# Altium footprint library con-amp.PCBLIB: 295 footprints (part 11 of 19)
Each footprint in its own frame and in the unit in brackets; x right, y up, seen from the top. Pads: shape width x height; smd on the part's side, far side on the other; paste and mask are expansions set on the pad; w line width, h text height; cw(c..) or ccw(c..) is an arc to the next point about the centre after c.
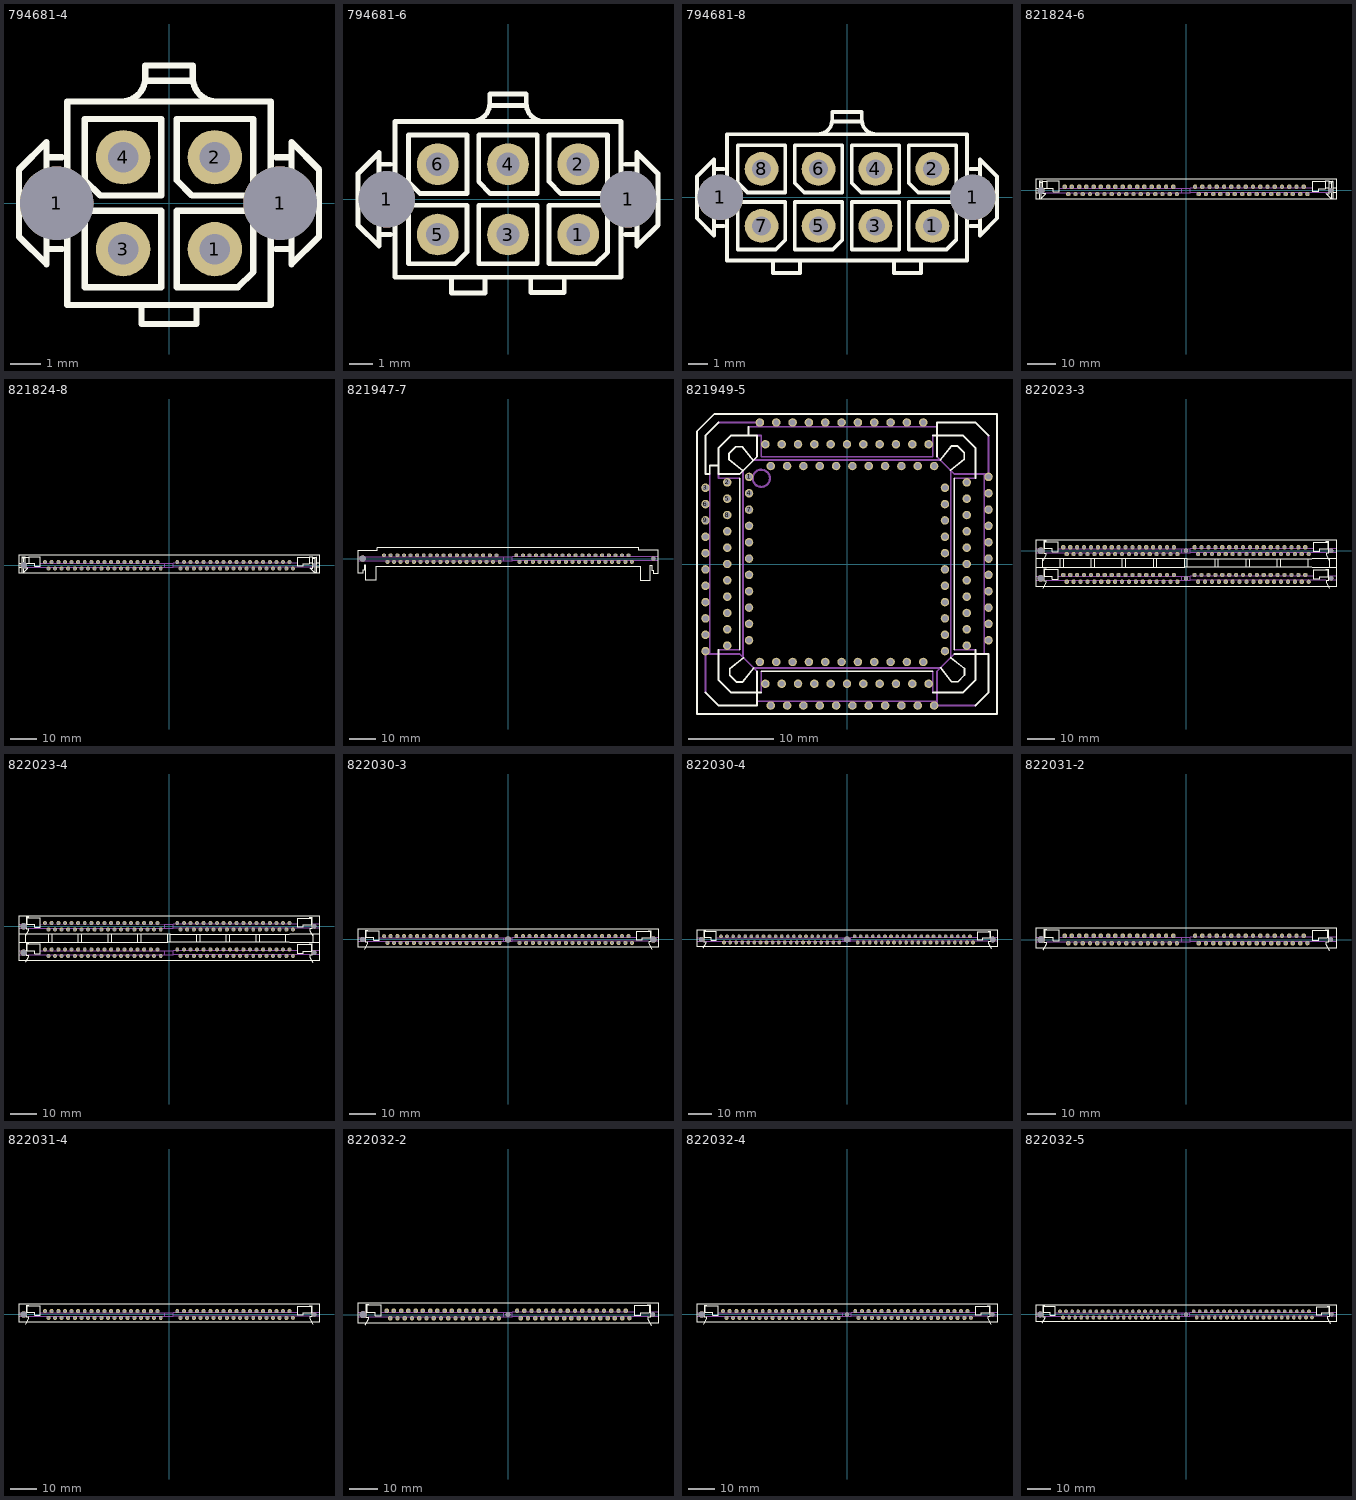
[diagram p10: the footprints below, top view; thin cyan lines are the x and y axes]

## 794681-4 [mil]
pads (6):
  round 94.49 hole 94.49: 1(-144.49,0) 1(142.91,0)
  round 70 hole 39.37: 1(59.06,-59.06) 2(59.06,59.06) 3(-59.06,-59.06) 4(-59.06,59.06)
Top Overlay:
  lines w8: -137.8,-59.06 -157.48,-59.06 ; -137.8,59.06 -157.48,59.06 ; -61.02,130.91 ccw(c-61.02,161.42) -30.51,161.42 -30.51,177.17 30.51,177.17 30.51,161.42 ccw(c61.02,161.42) 61.02,130.91 ; -35.43,-133.86 -35.43,-155.51 35.43,-155.51 35.43,-134.84 ; -29.53,157.48 29.53,157.48 ; 137.8,-59.06 157.48,-59.06 ; 137.8,59.06 157.48,59.06 ; -157.48,-59.06 -157.48,59.06 ; -157.48,-59.06 -157.48,-78.74 -192.91,-43.31 -192.91,43.31 -157.48,78.74 -157.48,59.06 ; 157.48,-59.06 157.48,59.06 ; 157.48,-59.06 157.48,-78.74 192.91,-43.31 192.91,43.31 157.48,78.74 157.48,59.06 ; -130.91,-130.91 130.91,-130.91 130.91,130.91 -130.91,130.91 -130.91,-130.91 ; -108.27,-108.27 -108.27,-9.84 -9.84,-9.84 -9.84,-108.27 -108.27,-108.27 ; -108.27,29.53 -108.27,108.27 -9.84,108.27 -9.84,9.84 -88.58,9.84 -108.27,29.53 ; 9.84,-108.27 9.84,-9.84 108.27,-9.84 108.27,-88.58 88.58,-108.27 9.84,-108.27 ; 9.84,29.53 9.84,108.27 108.27,108.27 108.27,9.84 29.53,9.84 9.84,29.53

## 794681-6 [mil]
pads (8):
  round 94.49 hole 94.49: 1(-203.54,0) 1(201.97,0)
  round 70 hole 39.37: 1(118.11,-59.06) 2(118.11,59.06) 3(0,-59.06) 4(0,59.06) 5(-118.11,-59.06) 6(-118.11,59.06)
Top Overlay:
  lines w8: -196.85,-59.06 -216.54,-59.06 ; -196.85,59.06 -216.54,59.06 ; -94.69,-135.43 -94.69,-157.09 -38.58,-157.09 -38.58,-135.43 ; -61.02,130.91 ccw(c-61.02,161.42) -30.51,161.42 -30.51,177.17 30.51,177.17 30.51,161.42 ccw(c61.02,161.42) 61.02,130.91 ; -29.53,157.48 29.53,157.48 ; 38.39,-134.84 38.39,-156.5 94.49,-156.5 94.49,-134.84 ; 196.85,-59.06 216.54,-59.06 ; 196.85,59.06 216.54,59.06 ; -216.54,-59.06 -216.54,59.06 ; -216.54,-59.06 -216.54,-78.74 -251.97,-43.31 -251.97,43.31 -216.54,78.74 -216.54,59.06 ; 216.54,-59.06 216.54,59.06 ; 216.54,-59.06 216.54,-78.74 251.97,-43.31 251.97,43.31 216.54,78.74 216.54,59.06 ; -189.96,-130.91 189.96,-130.91 189.96,130.91 -189.96,130.91 -189.96,-130.91 ; -167.32,-108.27 -167.32,-9.84 -68.9,-9.84 -68.9,-88.58 -88.58,-108.27 -167.32,-108.27 ; -167.32,29.53 -167.32,108.27 -68.9,108.27 -68.9,9.84 -147.64,9.84 -167.32,29.53 ; -49.21,-108.27 -49.21,-9.84 49.21,-9.84 49.21,-108.27 -49.21,-108.27 ; -49.21,29.53 -49.21,108.27 49.21,108.27 49.21,9.84 -29.53,9.84 -49.21,29.53 ; 68.9,-108.27 68.9,-9.84 167.32,-9.84 167.32,-88.58 147.64,-108.27 68.9,-108.27 ; 68.9,29.53 68.9,108.27 167.32,108.27 167.32,9.84 88.58,9.84 68.9,29.53

## 794681-8 [mil]
pads (10):
  round 94.49 hole 94.49: 1(-262.6,0) 1(261.02,0)
  round 70 hole 39.37: 1(177.17,-59.06) 2(177.17,59.06) 3(59.06,-59.06) 4(59.06,59.06) 5(-59.06,-59.06) 6(-59.06,59.06) 7(-177.17,-59.06) 8(-177.17,59.06)
Top Overlay:
  lines w8: -255.91,-59.06 -275.59,-59.06 ; -255.91,59.06 -275.59,59.06 ; -153.74,-135.43 -153.74,-157.09 -97.64,-157.09 -97.64,-135.43 ; -61.02,130.91 ccw(c-61.02,161.42) -30.51,161.42 -30.51,177.17 30.51,177.17 30.51,161.42 ccw(c61.02,161.42) 61.02,130.91 ; -29.53,157.48 29.53,157.48 ; 97.44,-134.84 97.44,-156.5 153.54,-156.5 153.54,-134.84 ; 255.91,-59.06 275.59,-59.06 ; 255.91,59.06 275.59,59.06 ; -275.59,-59.06 -275.59,59.06 ; -275.59,-59.06 -275.59,-78.74 -311.02,-43.31 -311.02,43.31 -275.59,78.74 -275.59,59.06 ; 275.59,-59.06 275.59,59.06 ; 275.59,-59.06 275.59,-78.74 311.02,-43.31 311.02,43.31 275.59,78.74 275.59,59.06 ; -249.02,-130.91 249.02,-130.91 249.02,130.91 -249.02,130.91 -249.02,-130.91 ; -226.38,-108.27 -226.38,-9.84 -127.95,-9.84 -127.95,-88.58 -147.64,-108.27 -226.38,-108.27 ; -226.38,29.53 -226.38,108.27 -127.95,108.27 -127.95,9.84 -206.69,9.84 -226.38,29.53 ; -108.27,-108.27 -29.53,-108.27 -9.84,-88.58 -9.84,-9.84 -108.27,-9.84 -108.27,-108.27 ; -108.27,29.53 -108.27,108.27 -9.84,108.27 -9.84,9.84 -88.58,9.84 -108.27,29.53 ; 9.84,-108.27 9.84,-9.84 108.27,-9.84 108.27,-108.27 9.84,-108.27 ; 9.84,29.53 9.84,108.27 108.27,108.27 108.27,9.84 29.53,9.84 9.84,29.53 ; 127.95,-108.27 127.95,-9.84 226.38,-9.84 226.38,-88.58 206.69,-108.27 127.95,-108.27 ; 127.95,29.53 127.95,108.27 226.38,108.27 226.38,9.84 147.64,9.84 127.95,29.53

## 821824-6 [mil]
pads (66):
  round 95 hole 95: 1(-2000,0)
  round 60 hole 40: 1(1675,-50)
  round 64 hole 64: 1(2000,0)
  oct 60x60 hole 40: 2(1625,50) 3(1575,-50) 4(1525,50) 5(1475,-50) 6(1425,50) 7(1375,-50) 8(1325,50) 9(1275,-50) 10(1225,50) 11(1175,-50) 12(1125,50) 13(1075,-50) 14(1025,50) 15(975,-50) 16(925,50) 17(875,-50) 18(825,50) 19(775,-50) 20(725,50) 21(675,-50) 22(625,50) 23(575,-50) 24(525,50) 25(475,-50) 26(425,50) 27(375,-50) 28(325,50) 29(275,-50) 30(225,50) 31(175,-50) 32(125,50) 33(-125,-50) 34(-175,50) 35(-225,-50) 36(-275,50) 37(-325,-50) 38(-375,50) 39(-425,-50) 40(-475,50) 41(-525,-50) 42(-575,50) 43(-625,-50) 44(-675,50) 45(-725,-50) 46(-775,50) 47(-825,-50) 48(-875,50) 49(-925,-50) 50(-975,50) 51(-1025,-50) 52(-1075,50) 53(-1125,-50) 54(-1175,50) 55(-1225,-50) 56(-1275,50) 57(-1325,-50) 58(-1375,50) 59(-1425,-50) 60(-1475,50) 61(-1525,-50) 62(-1575,50) 63(-1625,-50) 64(-1675,50)
Top Overlay:
  lines w6: -2070,-30 -2025,-30 ; -2070,30 -2025,30 ; -1930,30 -1975,30 ; 1930,30 1975,30 ; 2025,-115 2025,125 ; 2025,-30 2070,-30 ; 2025,30 2070,30 ; -2025,125 -2025,-115 -2005,-115 ; -2025,125 -1975,125 ; -2025,125 -2005,105 ; -2005,-115 -1935,-45 -1975,-45 -1975,30 ; -2005,-115 -2005,105 ; -2005,105 -1975,105 ; -1975,30 -1975,105 ; -1975,105 -1975,125 ; -1975,125 -1925,125 ; -1925,125 -1750,125 -1750,-15 -1835,-15 -1835,25 -1925,25 -1925,125 ; 1925,125 1750,125 1750,-15 1835,-15 1835,25 1925,25 1925,125 ; 1925,125 1975,125 ; 1975,30 1975,-45 1935,-45 2005,-115 2005,105 ; 1975,30 1975,105 ; 1975,105 1975,125 ; 1975,105 2005,105 ; 1975,125 2025,125 ; 2005,105 2025,125
  lines w10: -2070,-120 2070,-120 2070,-30 2070,30 2070,160 -2070,160 -2070,-120
Mechanical 16:
  lines w6: -1975,-30 -62,-30 ; -1745,30 -62,30 ; 1750,30 62,30 ; 1975,-30 62,-30 ; 2005,-115 2025,-115 ; -62,-30 62,-30 ; -62,-30 -62,30 ; -62,30 62,30 ; 62,-30 62,30

## 821824-8 [mil]
pads (74):
  round 95 hole 95: 1(-2200,0)
  round 60 hole 40: 1(1875,-50)
  round 64 hole 64: 1(2200,0)
  oct 60x60 hole 40: 2(1825,50) 3(1775,-50) 4(1725,50) 5(1675,-50) 6(1625,50) 7(1575,-50) 8(1525,50) 9(1475,-50) 10(1425,50) 11(1375,-50) 12(1325,50) 13(1275,-50) 14(1225,50) 15(1175,-50) 16(1125,50) 17(1075,-50) 18(1025,50) 19(975,-50) 20(925,50) 21(875,-50) 22(825,50) 23(775,-50) 24(725,50) 25(675,-50) 26(625,50) 27(575,-50) 28(525,50) 29(475,-50) 30(425,50) 31(375,-50) 32(325,50) 33(275,-50) 34(225,50) 35(175,-50) 36(125,50) 37(-125,-50) 38(-175,50) 39(-225,-50) 40(-275,50) 41(-325,-50) 42(-375,50) 43(-425,-50) 44(-475,50) 45(-525,-50) 46(-575,50) 47(-625,-50) 48(-675,50) 49(-725,-50) 50(-775,50) 51(-825,-50) 52(-875,50) 53(-925,-50) 54(-975,50) 55(-1025,-50) 56(-1075,50) 57(-1125,-50) 58(-1175,50) 59(-1225,-50) 60(-1275,50) 61(-1325,-50) 62(-1375,50) 63(-1425,-50) 64(-1475,50) 65(-1525,-50) 66(-1575,50) 67(-1625,-50) 68(-1675,50) 69(-1725,-50) 70(-1775,50) 71(-1825,-50) 72(-1875,50)
Top Overlay:
  lines w6: -2270,-30 -2225,-30 ; -2270,30 -2225,30 ; -2130,30 -2175,30 ; 2170,30 2125,30 ; 2225,-30 2270,-30 ; 2225,30 2270,30 ; -2225,125 -2225,-115 -2205,-115 ; -2225,125 -2175,125 ; -2225,125 -2205,105 ; -2205,-115 -2135,-45 -2175,-45 -2175,30 ; -2205,-115 -2205,105 ; -2205,105 -2175,105 ; -2175,30 -2175,105 ; -2175,105 -2175,125 ; -2175,125 -2125,125 ; -2125,125 -1950,125 -1950,-15 -2035,-15 -2035,25 -2125,25 -2125,125 ; 2125,30 2125,125 ; 2125,30 2125,25 2035,25 2035,-15 1950,-15 1950,125 2125,125 ; 2125,125 2175,125 ; 2175,105 2175,-45 2135,-45 2205,-115 ; 2175,105 2175,125 ; 2175,105 2205,105 ; 2175,125 2225,125 ; 2205,-115 2225,-115 2225,125 ; 2205,-115 2205,105 ; 2205,105 2225,125
  lines w10: -2270,-120 2270,-120 2270,-30 2270,30 2270,160 -2270,160 -2270,-120
Mechanical 16:
  lines w6: -2170,-30 -62,-30 ; -1945,30 -62,30 ; 1945,30 62,30 ; 2175,-30 62,-30 ; -62,-30 62,-30 ; -62,-30 -62,30 ; -62,30 62,30 ; 62,-30 62,30

## 821947-7 [mil]
pads (74):
  round 95 hole 95: 1(-2200,0)
  round 60 hole 40: 1(1875,-50)
  round 64 hole 64: 1(2200,0)
  oct 60x60 hole 40: 2(1825,50) 3(1775,-50) 4(1725,50) 5(1675,-50) 6(1625,50) 7(1575,-50) 8(1525,50) 9(1475,-50) 10(1425,50) 11(1375,-50) 12(1325,50) 13(1275,-50) 14(1225,50) 15(1175,-50) 16(1125,50) 17(1075,-50) 18(1025,50) 19(975,-50) 20(925,50) 21(875,-50) 22(825,50) 23(775,-50) 24(725,50) 25(675,-50) 26(625,50) 27(575,-50) 28(525,50) 29(475,-50) 30(425,50) 31(375,-50) 32(325,50) 33(275,-50) 34(225,50) 35(175,-50) 36(125,50) 37(-125,-50) 38(-175,50) 39(-225,-50) 40(-275,50) 41(-325,-50) 42(-375,50) 43(-425,-50) 44(-475,50) 45(-525,-50) 46(-575,50) 47(-625,-50) 48(-675,50) 49(-725,-50) 50(-775,50) 51(-825,-50) 52(-875,50) 53(-925,-50) 54(-975,50) 55(-1025,-50) 56(-1075,50) 57(-1125,-50) 58(-1175,50) 59(-1225,-50) 60(-1275,50) 61(-1325,-50) 62(-1375,50) 63(-1425,-50) 64(-1475,50) 65(-1525,-50) 66(-1575,50) 67(-1625,-50) 68(-1675,50) 69(-1725,-50) 70(-1775,50) 71(-1825,-50) 72(-1875,50)
Top Overlay:
  lines w10: -2270,-220 -2200,-220 -2200,-175 -2175,-175 -2175,-100 -2150,-100 -2150,-325 -2000,-325 -2000,-120 2000,-120 2000,-325 2150,-325 2150,-100 2175,-100 2175,-175 2200,-175 2200,-220 2270,-220 2270,125 1975,125 1975,160 -1975,160 -1975,125 -2270,125 -2270,-220
Mechanical 16:
  lines w6: -2260,-30 -62,-30 ; -2260,30 -62,30 ; 2265,-30 62,-30 ; 2265,30 62,30 ; -62,-30 62,-30 ; -62,-30 -62,30 ; -62,30 62,30 ; 62,-30 62,30

## 821949-5 [mil]
pads (132):
  round 39 hole 26: 1(-450,400) 2(-550,375) 3(-650,350) 4(-450,325) 5(-550,300) 6(-650,275) 7(-450,250) 8(-550,225) 9(-650,200) 10(-450,175) 11(-550,150) 12(-650,125) 13(-450,100) 14(-550,75) 15(-650,50) 16(-450,25) 17(-550,0) 18(-650,-25) 19(-450,-50) 20(-550,-75) 21(-650,-100) 22(-450,-125) 23(-550,-150) 24(-650,-175) 25(-450,-200) 26(-550,-225) 27(-650,-250) 28(-450,-275) 29(-550,-300) 30(-650,-325) 31(-450,-350) 32(-550,-375) 33(-650,-400) 34(-400,-450) 35(-375,-550) 36(-350,-650) 37(-325,-450) 38(-300,-550) 39(-275,-650) 40(-250,-450) 41(-225,-550) 42(-200,-650) 43(-175,-450) 44(-150,-550) 45(-125,-650) 46(-100,-450) 47(-75,-550) 48(-50,-650) 49(-25,-450) 50(0,-550) 51(25,-650) 52(50,-450) 53(75,-550) 54(100,-650) 55(125,-450) 56(150,-550) 57(175,-650) 58(200,-450) 59(225,-550) 60(250,-650) 61(275,-450) 62(300,-550) 63(325,-650) 64(350,-450) 65(375,-550) 66(400,-650) 67(450,-400) 68(550,-375) 69(650,-350) 70(450,-325) 71(550,-300) 72(650,-275) 73(450,-250) 74(550,-225) 75(650,-200) 76(450,-175) 77(550,-150) 78(650,-125) 79(450,-100) 80(550,-75) 81(650,-50) 82(450,-25) 83(550,0) 84(650,25) 85(450,50) 86(550,75) 87(650,100) 88(450,125) 89(550,150) 90(650,175) 91(450,200) 92(550,225) 93(650,250) 94(450,275) 95(550,300) 96(650,325) 97(450,350) 98(550,375) 99(650,400) 100(400,450) 101(375,550) 102(350,650) 103(325,450) 104(300,550) 105(275,650) 106(250,450) 107(225,550) 108(200,650) 109(175,450) 110(150,550) 111(125,650) 112(100,450) 113(75,550) 114(50,650) 115(25,450) 116(0,550) 117(-25,650) 118(-50,450) 119(-75,550) 120(-100,650) 121(-125,450) 122(-150,550) 123(-175,650) 124(-200,450) 125(-225,550) 126(-250,650) 127(-275,450) 128(-300,550) 129(-325,650) 130(-350,450) 131(-375,550) 132(-400,650)
Top Overlay:
  lines w8: -649.61,-590.55 -590.55,-649.61 -413.39,-649.61 -413.39,-492.13 ; -590.55,-393.7 -590.55,-531.5 -531.5,-590.55 -393.7,-590.55 ; -590.55,649.61 -649.61,590.55 -649.61,413.39 -629.92,413.39 -629.92,452.76 -590.55,452.76 ; -541.73,478.43 -541.73,508.43 ; -541.18,478.43 -477.95,428.43 ; -541.18,508.43 -511.18,538.98 -481.18,538.98 ; -538.98,-481.18 -538.98,-511.18 -508.43,-541.18 ; -538.43,-481.18 -475.2,-431.18 ; -508.43,-541.73 -478.43,-541.73 ; -492.13,-393.7 -492.13,393.7 ; -481.18,538.43 -431.18,475.2 ; -478.43,-541.18 -428.43,-477.95 ; -452.76,629.92 -452.76,590.55 ; -393.7,-492.13 393.7,-492.13 ; 393.7,-590.55 531.5,-590.55 590.55,-531.5 590.55,-393.7 ; 393.7,590.55 531.5,590.55 590.55,531.5 590.55,393.7 ; 413.39,492.13 413.39,649.61 590.55,649.61 649.61,590.55 ; 428.43,477.95 478.43,541.18 ; 429.61,-476.77 479.61,-540 ; 475.2,431.18 538.43,481.18 ; 476.38,-430 539.61,-480 ; 478.43,541.73 508.43,541.73 ; 479.61,-540.55 509.61,-540.55 539.61,-510 ; 492.13,-413.39 649.61,-413.39 649.61,-590.55 590.55,-649.61 ; 492.13,-393.7 492.13,393.7 ; 508.43,541.18 538.98,511.18 538.98,481.18 ; 540.16,-510 540.16,-480 ; -590.55,452.76 -590.55,531.5 -531.5,590.55 -452.76,590.55 ; -590.55,452.76 -590.55,413.39 -492.13,413.39 -413.39,492.13 -413.39,590.55 -452.76,590.55 ; -688.98,-688.98 688.98,-688.98 688.98,688.98 -610.24,688.98 -688.98,610.24 -688.98,-688.98
Mechanical 16:
  circle w10: c-393.7,393.7 r39.37
  lines w8: -649.61,-590.55 -649.61,-413.39 -629.92,-413.39 ; -629.92,413.39 -629.92,-413.39 ; -590.55,-393.7 -492.13,-393.7 ; -590.55,413.39 -590.55,393.7 -492.13,393.7 ; -590.55,649.61 -413.39,649.61 -413.39,629.92 ; -477.95,-431.57 -477.95,425.2 ; -452.76,629.92 -413.39,629.92 ; -431.57,477.95 425.2,477.95 ; -425.2,-477.95 431.57,-477.95 ; -413.39,-629.92 413.39,-629.92 ; -413.39,-492.13 -492.13,-413.39 -629.92,-413.39 ; -413.39,590.55 -393.7,590.55 -393.7,492.13 393.7,492.13 393.7,590.55 ; -393.7,-590.55 -393.7,-492.13 ; 393.7,-590.55 393.7,-492.13 ; 413.39,492.13 492.13,413.39 629.92,413.39 ; 413.39,629.92 -413.39,629.92 ; 476.38,-430 476.38,430 ; 492.13,-413.39 413.39,-492.13 413.39,-629.92 ; 492.13,-393.7 590.55,-393.7 ; 492.13,393.7 590.55,393.7 ; 590.55,-649.61 413.39,-649.61 413.39,-629.92 ; 629.92,-413.39 629.92,413.39 ; 649.61,590.55 649.61,413.39 629.92,413.39

## 822023-3 [mil]
pads (142):
  round 96 hole 96: 1(-2100,-400) 1(-2100,0)
  round 64 hole 64: 1(0,-400) 1(0,0) 1(2100,-400) 1(2100,0)
  round 60 hole 40: 1-1(1775,-50) 2-1(1775,-450)
  oct 60x60 hole 40: 1-2(1725,50) 1-3(1675,-50) 1-4(1625,50) 1-5(1575,-50) 1-6(1525,50) 1-7(1475,-50) 1-8(1425,50) 1-9(1375,-50) 1-10(1325,50) 1-11(1275,-50) 1-12(1225,50) 1-13(1175,-50) 1-14(1125,50) 1-15(1075,-50) 1-16(1025,50) 1-17(975,-50) 1-18(925,50) 1-19(875,-50) 1-20(825,50) 1-21(775,-50) 1-22(725,50) 1-23(675,-50) 1-24(625,50) 1-25(575,-50) 1-26(525,50) 1-27(475,-50) 1-28(425,50) 1-29(375,-50) 1-30(325,50) 1-31(275,-50) 1-32(225,50) 1-33(175,-50) 1-34(125,50) 1-35(-125,-50) 1-36(-175,50) 1-37(-225,-50) 1-38(-275,50) 1-39(-325,-50) 1-40(-375,50) 1-41(-425,-50) 1-42(-475,50) 1-43(-525,-50) 1-44(-575,50) 1-45(-625,-50) 1-46(-675,50) 1-47(-725,-50) 1-48(-775,50) 1-49(-825,-50) 1-50(-875,50) 1-51(-925,-50) 1-52(-975,50) 1-53(-1025,-50) 1-54(-1075,50) 1-55(-1125,-50) 1-56(-1175,50) 1-57(-1225,-50) 1-58(-1275,50) 1-59(-1325,-50) 1-60(-1375,50) 1-61(-1425,-50) 1-62(-1475,50) 1-63(-1525,-50) 1-64(-1575,50) 1-65(-1625,-50) 1-66(-1675,50) 1-67(-1725,-50) 1-68(-1775,50) 2-2(1725,-350) 2-3(1675,-450) 2-4(1625,-350) 2-5(1575,-450) 2-6(1525,-350) 2-7(1475,-450) 2-8(1425,-350) 2-9(1375,-450) 2-10(1325,-350) 2-11(1275,-450) 2-12(1225,-350) 2-13(1175,-450) 2-14(1125,-350) 2-15(1075,-450) 2-16(1025,-350) 2-17(975,-450) 2-18(925,-350) 2-19(875,-450) 2-20(825,-350) 2-21(775,-450) 2-22(725,-350) 2-23(675,-450) 2-24(625,-350) 2-25(575,-450) 2-26(525,-350) 2-27(475,-450) 2-28(425,-350) 2-29(375,-450) 2-30(325,-350) 2-31(275,-450) 2-32(225,-350) 2-33(175,-450) 2-34(125,-350) 2-35(-125,-450) 2-36(-175,-350) 2-37(-225,-450) 2-38(-275,-350) 2-39(-325,-450) 2-40(-375,-350) 2-41(-425,-450) 2-42(-475,-350) 2-43(-525,-450) 2-44(-575,-350) 2-45(-625,-450) 2-46(-675,-350) 2-47(-725,-450) 2-48(-775,-350) 2-49(-825,-450) 2-50(-875,-350) 2-51(-925,-450) 2-52(-975,-350) 2-53(-1025,-450) 2-54(-1075,-350) 2-55(-1125,-450) 2-56(-1175,-350) 2-57(-1225,-450) 2-58(-1275,-350) 2-59(-1325,-450) 2-60(-1375,-350) 2-61(-1425,-450) 2-62(-1475,-350) 2-63(-1525,-450) 2-64(-1575,-350) 2-65(-1625,-450) 2-66(-1675,-350) 2-67(-1725,-450) 2-68(-1775,-350)
Top Overlay:
  lines w6: -2050,-375 -2050,-275 -1850,-275 -1850,-415 -1935,-415 -1935,-375 -2050,-375 ; -2050,25 -2050,125 -1850,125 -1850,-15 -1935,-15 -1935,25 -2050,25 ; 1850,-415 1850,-275 2050,-275 2050,-375 1935,-375 1935,-415 1850,-415 ; 1850,-15 1850,125 2050,125 2050,25 1935,25 1935,-15 1850,-15
  lines w10: 1820,-240 1770,-240 ; 1820,-120 1770,-120 ; 1830,-240 2080,-240 ; 1830,-120 2080,-120 ; -2170,-240 -2070,-240 ; -2170,-240 -2170,-520 2170,-520 2170,-240 ; -2170,-240 -2170,-120 ; -2170,-120 -2070,-120 ; -2170,-120 -2170,160 2170,160 2170,-120 ; -2070,-240 -1820,-240 ; -2070,-240 -2070,-120 ; -2070,-120 -1820,-120 ; -1820,-240 -1770,-240 ; -1820,-240 -1820,-120 ; -1820,-120 -1770,-120 ; -1770,-240 -1370,-240 ; -1770,-240 -1770,-120 ; -1770,-120 -1370,-120 ; -1370,-240 -1320,-240 ; -1370,-240 -1370,-120 ; -1370,-120 -1320,-120 ; -1320,-240 -920,-240 ; -1320,-240 -1320,-120 ; -1320,-120 -920,-120 ; -920,-240 -870,-240 ; -920,-240 -920,-120 ; -920,-120 -870,-120 ; -870,-240 -470,-240 ; -870,-240 -870,-120 ; -870,-120 -470,-120 ; -470,-240 -420,-240 ; -470,-240 -470,-120 ; -470,-120 -420,-120 ; -420,-240 -20,-240 ; -420,-240 -420,-120 ; -420,-120 -20,-120 ; -20,-240 -20,-120 ; -20,-240 20,-240 ; -20,-120 20,-120 ; 20,-240 420,-240 ; 20,-240 20,-120 ; 20,-120 420,-120 ; 420,-240 470,-240 ; 420,-240 420,-120 ; 420,-120 470,-120 ; 470,-240 870,-240 ; 470,-240 470,-120 ; 470,-120 870,-120 ; 870,-240 920,-240 ; 870,-240 870,-120 ; 870,-120 920,-120 ; 920,-240 1320,-240 ; 920,-240 920,-120 ; 920,-120 1320,-120 ; 1320,-240 1370,-240 ; 1320,-240 1320,-120 ; 1320,-120 1370,-120 ; 1370,-240 1770,-240 ; 1370,-240 1370,-120 ; 1370,-120 1770,-120 ; 1770,-240 1770,-120 ; 2080,-240 2170,-240 ; 2080,-240 2080,-120 ; 2080,-120 2170,-120 ; 2170,-240 2170,-120
  lines w16: -2075,-545 -2030,-465 -2030,-435 -2060,-435 -2060,-265 -2025,-265 ; -2075,-145 -2030,-65 -2030,-35 -2060,-35 -2060,135 -2025,135 ; 2025,-265 2060,-265 2060,-435 2030,-435 2030,-465 2075,-545 ; 2025,135 2060,135 2060,-35 2030,-35 2030,-65 2075,-145
Mechanical 16:
  lines w6: -2170,-430 -2070,-430 ; -2170,-370 -2070,-370 ; -2170,-30 -2075,-30 ; -2170,30 -2070,30 ; -2030,-30 -62,-30 ; -2025,-430 -62,-430 ; -1850,-370 -62,-370 ; -1845,30 -62,30 ; 1845,-370 62,-370 ; 1845,30 62,30 ; 2025,-430 62,-430 ; 2025,-30 62,-30 ; 2065,30 2170,30 ; 2070,-370 2170,-370 ; 2070,-30 2170,-30 ; 2075,-430 2170,-430 ; -62,-430 62,-430 ; -62,-430 -62,-370 ; -62,-370 62,-370 ; -62,-30 62,-30 ; -62,-30 -62,30 ; -62,30 62,30 ; 62,-430 62,-370 ; 62,-30 62,30

## 822023-4 [mil]
pads (148):
  round 96 hole 96: 1(-2200,-400) 1(-2200,0)
  round 64 hole 64: 1(2200,-400) 1(2200,0)
  round 60 hole 40: 1-1(1875,-50) 2-1(1875,-450)
  oct 60x60 hole 40: 1-2(1825,50) 1-3(1775,-50) 1-4(1725,50) 1-5(1675,-50) 1-6(1625,50) 1-7(1575,-50) 1-8(1525,50) 1-9(1475,-50) 1-10(1425,50) 1-11(1375,-50) 1-12(1325,50) 1-13(1275,-50) 1-14(1225,50) 1-15(1175,-50) 1-16(1125,50) 1-17(1075,-50) 1-18(1025,50) 1-19(975,-50) 1-20(925,50) 1-21(875,-50) 1-22(825,50) 1-23(775,-50) 1-24(725,50) 1-25(675,-50) 1-26(625,50) 1-27(575,-50) 1-28(525,50) 1-29(475,-50) 1-30(425,50) 1-31(375,-50) 1-32(325,50) 1-33(275,-50) 1-34(225,50) 1-35(175,-50) 1-36(125,50) 1-37(-125,-50) 1-38(-175,50) 1-39(-225,-50) 1-40(-275,50) 1-41(-325,-50) 1-42(-375,50) 1-43(-425,-50) 1-44(-475,50) 1-45(-525,-50) 1-46(-575,50) 1-47(-625,-50) 1-48(-675,50) 1-49(-725,-50) 1-50(-775,50) 1-51(-825,-50) 1-52(-875,50) 1-53(-925,-50) 1-54(-975,50) 1-55(-1025,-50) 1-56(-1075,50) 1-57(-1125,-50) 1-58(-1175,50) 1-59(-1225,-50) 1-60(-1275,50) 1-61(-1325,-50) 1-62(-1375,50) 1-63(-1425,-50) 1-64(-1475,50) 1-65(-1525,-50) 1-66(-1575,50) 1-67(-1625,-50) 1-68(-1675,50) 1-69(-1725,-50) 1-70(-1775,50) 1-71(-1825,-50) 1-72(-1875,50) 2-2(1825,-350) 2-3(1775,-450) 2-4(1725,-350) 2-5(1675,-450) 2-6(1625,-350) 2-7(1575,-450) 2-8(1525,-350) 2-9(1475,-450) 2-10(1425,-350) 2-11(1375,-450) 2-12(1325,-350) 2-13(1275,-450) 2-14(1225,-350) 2-15(1175,-450) 2-16(1125,-350) 2-17(1075,-450) 2-18(1025,-350) 2-19(975,-450) 2-20(925,-350) 2-21(875,-450) 2-22(825,-350) 2-23(775,-450) 2-24(725,-350) 2-25(675,-450) 2-26(625,-350) 2-27(575,-450) 2-28(525,-350) 2-29(475,-450) 2-30(425,-350) 2-31(375,-450) 2-32(325,-350) 2-33(275,-450) 2-34(225,-350) 2-35(175,-450) 2-36(125,-350) 2-37(-125,-450) 2-38(-175,-350) 2-39(-225,-450) 2-40(-275,-350) 2-41(-325,-450) 2-42(-375,-350) 2-43(-425,-450) 2-44(-475,-350) 2-45(-525,-450) 2-46(-575,-350) 2-47(-625,-450) 2-48(-675,-350) 2-49(-725,-450) 2-50(-775,-350) 2-51(-825,-450) 2-52(-875,-350) 2-53(-925,-450) 2-54(-975,-350) 2-55(-1025,-450) 2-56(-1075,-350) 2-57(-1125,-450) 2-58(-1175,-350) 2-59(-1225,-450) 2-60(-1275,-350) 2-61(-1325,-450) 2-62(-1375,-350) 2-63(-1425,-450) 2-64(-1475,-350) 2-65(-1525,-450) 2-66(-1575,-350) 2-67(-1625,-450) 2-68(-1675,-350) 2-69(-1725,-450) 2-70(-1775,-350) 2-71(-1825,-450) 2-72(-1875,-350)
Top Overlay:
  lines w6: -2150,-375 -2150,-275 -1950,-275 -1950,-415 -2035,-415 -2035,-375 -2150,-375 ; -2150,25 -2150,125 -1950,125 -1950,-15 -2035,-15 -2035,25 -2150,25 ; 1950,-415 1950,-275 2150,-275 2150,-375 2035,-375 2035,-415 1950,-415 ; 1950,-15 1950,125 2150,125 2150,25 2035,25 2035,-15 1950,-15
  lines w10: 1820,-240 1770,-240 ; 1820,-120 1770,-120 ; 1830,-240 2180,-240 ; 1830,-120 2180,-120 ; -2270,-240 -2170,-240 ; -2270,-240 -2270,-520 2270,-520 2270,-240 ; -2270,-240 -2270,-120 ; -2270,-120 -2170,-120 ; -2270,-120 -2270,160 2270,160 2270,-120 ; -2170,-240 -1820,-240 ; -2170,-240 -2170,-120 ; -2170,-120 -1820,-120 ; -1820,-240 -1770,-240 ; -1820,-240 -1820,-120 ; -1820,-120 -1770,-120 ; -1770,-240 -1370,-240 ; -1770,-240 -1770,-120 ; -1770,-120 -1370,-120 ; -1370,-240 -1320,-240 ; -1370,-240 -1370,-120 ; -1370,-120 -1320,-120 ; -1320,-240 -920,-240 ; -1320,-240 -1320,-120 ; -1320,-120 -920,-120 ; -920,-240 -870,-240 ; -920,-240 -920,-120 ; -920,-120 -870,-120 ; -870,-240 -470,-240 ; -870,-240 -870,-120 ; -870,-120 -470,-120 ; -470,-240 -420,-240 ; -470,-240 -470,-120 ; -470,-120 -420,-120 ; -420,-240 -20,-240 ; -420,-240 -420,-120 ; -420,-120 -20,-120 ; -20,-240 -20,-120 ; -20,-240 20,-240 ; -20,-120 20,-120 ; 20,-240 420,-240 ; 20,-240 20,-120 ; 20,-120 420,-120 ; 420,-240 470,-240 ; 420,-240 420,-120 ; 420,-120 470,-120 ; 470,-240 870,-240 ; 470,-240 470,-120 ; 470,-120 870,-120 ; 870,-240 920,-240 ; 870,-240 870,-120 ; 870,-120 920,-120 ; 920,-240 1320,-240 ; 920,-240 920,-120 ; 920,-120 1320,-120 ; 1320,-240 1370,-240 ; 1320,-240 1320,-120 ; 1320,-120 1370,-120 ; 1370,-240 1770,-240 ; 1370,-240 1370,-120 ; 1370,-120 1770,-120 ; 1770,-240 1770,-120 ; 2180,-240 2270,-240 ; 2180,-240 2180,-120 ; 2180,-120 2270,-120 ; 2270,-240 2270,-120
  lines w16: -2175,-545 -2130,-465 -2130,-435 -2160,-435 -2160,-265 -2125,-265 ; -2175,-145 -2130,-65 -2130,-35 -2160,-35 -2160,135 -2125,135 ; 2125,-265 2160,-265 2160,-435 2130,-435 2130,-465 2175,-545 ; 2125,135 2160,135 2160,-35 2130,-35 2130,-65 2175,-145
Mechanical 16:
  lines w6: -2270,-430 -2170,-430 ; -2270,-370 -2170,-370 ; -2270,-30 -2170,-30 ; -2270,30 -2170,30 ; -2135,-430 -62,-430 ; -2130,-30 -62,-30 ; -1945,-370 -62,-370 ; -1945,25 -62,30 ; 1945,-370 62,-370 ; 1945,30 62,30 ; 2130,-430 62,-430 ; 2135,-30 62,-30 ; 2170,-430 2265,-430 ; 2170,-370 2270,-370 ; 2170,-30 2270,-30 ; 2170,30 2270,30 ; -62,-430 62,-430 ; -62,-430 -62,-370 ; -62,-370 62,-370 ; -62,-30 62,-30 ; -62,-30 -62,30 ; -62,30 62,30 ; 62,-430 62,-370 ; 62,-30 62,30

## 822030-3 [mil]
pads (75):
  round 80 hole 80: 1(-2200,0)
  round 60 hole 40: 1(-1875,50)
  round 96 hole 96: 1(0,0) 1(2200,0)
  oct 60x60 hole 40: 2(-1825,-50) 3(-1775,50) 4(-1725,-50) 5(-1675,50) 6(-1625,-50) 7(-1575,50) 8(-1525,-50) 9(-1475,50) 10(-1425,-50) 11(-1375,50) 12(-1325,-50) 13(-1275,50) 14(-1225,-50) 15(-1175,50) 16(-1125,-50) 17(-1075,50) 18(-1025,-50) 19(-975,50) 20(-925,-50) 21(-875,50) 22(-825,-50) 23(-775,50) 24(-725,-50) 25(-675,50) 26(-625,-50) 27(-575,50) 28(-525,-50) 29(-475,50) 30(-425,-50) 31(-375,50) 32(-325,-50) 33(-275,50) 34(-225,-50) 35(-175,50) 36(-125,-50) 37(125,50) 38(175,-50) 39(225,50) 40(275,-50) 41(325,50) 42(375,-50) 43(425,50) 44(475,-50) 45(525,50) 46(575,-50) 47(625,50) 48(675,-50) 49(725,50) 50(775,-50) 51(825,50) 52(875,-50) 53(925,50) 54(975,-50) 55(1025,50) 56(1075,-50) 57(1125,50) 58(1175,-50) 59(1225,50) 60(1275,-50) 61(1325,50) 62(1375,-50) 63(1425,50) 64(1475,-50) 65(1525,50) 66(1575,-50) 67(1625,50) 68(1675,-50) 69(1725,50) 70(1775,-50) 71(1825,50) 72(1875,-50)
Top Overlay:
  lines w6: -2150,25 -2150,125 -1950,125 -1950,-15 -2035,-15 -2035,25 -2150,25 ; 1950,-15 1950,125 2150,125 2150,25 2035,25 2035,-15 1950,-15
  lines w10: -2270,-120 2270,-120 2270,160 -2270,160 -2270,-120
  lines w16: -2175,-145 -2130,-65 -2130,-35 -2160,-35 -2160,135 -2125,135 ; 2125,135 2160,135 2160,-35 2130,-35 2130,-65 2175,-145
Mechanical 16:
  lines w6: -2270,-30 -2170,-30 ; -2270,30 -2165,30 ; -2125,-30 -62,-30 ; -1945,30 -62,30 ; 1945,30 62,30 ; 2125,-30 62,-30 ; 2170,-30 2270,-30 ; 2175,30 2270,30 ; -62,-30 62,-30 ; -62,-30 -62,30 ; -62,30 62,30 ; 62,-30 62,30

## 822030-4 [mil]
pads (83):
  round 80 hole 80: 1(-2400,0)
  round 60 hole 40: 1(-2075,50)
  round 96 hole 96: 1(0,0) 1(2400,0)
  oct 60x60 hole 40: 2(-2025,-50) 3(-1975,50) 4(-1925,-50) 5(-1875,50) 6(-1825,-50) 7(-1775,50) 8(-1725,-50) 9(-1675,50) 10(-1625,-50) 11(-1575,50) 12(-1525,-50) 13(-1475,50) 14(-1425,-50) 15(-1375,50) 16(-1325,-50) 17(-1275,50) 18(-1225,-50) 19(-1175,50) 20(-1125,-50) 21(-1075,50) 22(-1025,-50) 23(-975,50) 24(-925,-50) 25(-875,50) 26(-825,-50) 27(-775,50) 28(-725,-50) 29(-675,50) 30(-625,-50) 31(-575,50) 32(-525,-50) 33(-475,50) 34(-425,-50) 35(-375,50) 36(-325,-50) 37(-275,50) 38(-225,-50) 39(-175,50) 40(-125,-50) 41(125,50) 42(175,-50) 43(225,50) 44(275,-50) 45(325,50) 46(375,-50) 47(425,50) 48(475,-50) 49(525,50) 50(575,-50) 51(625,50) 52(675,-50) 53(725,50) 54(775,-50) 55(825,50) 56(875,-50) 57(925,50) 58(975,-50) 59(1025,50) 60(1075,-50) 61(1125,50) 62(1175,-50) 63(1225,50) 64(1275,-50) 65(1325,50) 66(1375,-50) 67(1425,50) 68(1475,-50) 69(1525,50) 70(1575,-50) 71(1625,50) 72(1675,-50) 73(1725,50) 74(1775,-50) 75(1825,50) 76(1875,-50) 77(1925,50) 78(1975,-50) 79(2025,50) 80(2075,-50)
Top Overlay:
  lines w6: -2350,25 -2350,125 -2150,125 -2150,-15 -2235,-15 -2235,25 -2350,25 ; 2150,-15 2150,125 2350,125 2350,25 2235,25 2235,-15 2150,-15
  lines w10: -2470,-120 2470,-120 2470,160 -2470,160 -2470,-120
  lines w16: -2375,-145 -2330,-65 -2330,-35 -2360,-35 -2360,135 -2325,135 ; 2325,135 2360,135 2360,-35 2330,-35 2330,-65 2375,-145
Mechanical 16:
  lines w6: -2470,30 -2375,30 ; -2465,-30 -2370,-30 ; -2330,-30 -62,-30 ; -2145,30 -62,30 ; 2150,30 62,30 ; 2330,-30 62,-30 ; 2370,-30 2470,-30 ; 2370,30 2470,30 ; -62,-30 62,-30 ; -62,-30 -62,30 ; -62,30 62,30 ; 62,-30 62,30

## 822031-2 [mil]
pads (66):
  round 96 hole 96: 1(-2000,0)
  round 60 hole 40: 1(1675,-50)
  round 64 hole 64: 1(2000,0)
  oct 60x60 hole 40: 2(1625,50) 3(1575,-50) 4(1525,50) 5(1475,-50) 6(1425,50) 7(1375,-50) 8(1325,50) 9(1275,-50) 10(1225,50) 11(1175,-50) 12(1125,50) 13(1075,-50) 14(1025,50) 15(975,-50) 16(925,50) 17(875,-50) 18(825,50) 19(775,-50) 20(725,50) 21(675,-50) 22(625,50) 23(575,-50) 24(525,50) 25(475,-50) 26(425,50) 27(375,-50) 28(325,50) 29(275,-50) 30(225,50) 31(175,-50) 32(125,50) 33(-125,-50) 34(-175,50) 35(-225,-50) 36(-275,50) 37(-325,-50) 38(-375,50) 39(-425,-50) 40(-475,50) 41(-525,-50) 42(-575,50) 43(-625,-50) 44(-675,50) 45(-725,-50) 46(-775,50) 47(-825,-50) 48(-875,50) 49(-925,-50) 50(-975,50) 51(-1025,-50) 52(-1075,50) 53(-1125,-50) 54(-1175,50) 55(-1225,-50) 56(-1275,50) 57(-1325,-50) 58(-1375,50) 59(-1425,-50) 60(-1475,50) 61(-1525,-50) 62(-1575,50) 63(-1625,-50) 64(-1675,50)
Top Overlay:
  lines w6: -1950,25 -1950,125 -1750,125 -1750,-15 -1835,-15 -1835,25 -1950,25 ; 1750,-15 1750,125 1950,125 1950,25 1835,25 1835,-15 1750,-15
  lines w10: -2070,-120 2070,-120 2070,160 -2070,160 -2070,-120
  lines w16: -1975,-145 -1930,-65 -1930,-35 -1960,-35 -1960,135 -1925,135 ; 1925,135 1960,135 1960,-35 1930,-35 1930,-65 1975,-145
Mechanical 16:
  lines w6: -2070,-30 -1970,-30 ; -2070,30 -1970,30 ; -1925,-30 -62,-30 ; -1745,30 -62,30 ; 1745,30 62,30 ; 1925,-30 62,-30 ; 1970,-30 2070,-30 ; 1970,30 2070,30 ; -62,-30 62,-30 ; -62,-30 -62,30 ; -62,30 62,30 ; 62,-30 62,30

## 822031-4 [mil]
pads (74):
  round 96 hole 96: 1(-2200,0)
  round 60 hole 40: 1(1875,-50)
  round 64 hole 64: 1(2200,0)
  oct 60x60 hole 40: 2(1825,50) 3(1775,-50) 4(1725,50) 5(1675,-50) 6(1625,50) 7(1575,-50) 8(1525,50) 9(1475,-50) 10(1425,50) 11(1375,-50) 12(1325,50) 13(1275,-50) 14(1225,50) 15(1175,-50) 16(1125,50) 17(1075,-50) 18(1025,50) 19(975,-50) 20(925,50) 21(875,-50) 22(825,50) 23(775,-50) 24(725,50) 25(675,-50) 26(625,50) 27(575,-50) 28(525,50) 29(475,-50) 30(425,50) 31(375,-50) 32(325,50) 33(275,-50) 34(225,50) 35(175,-50) 36(125,50) 37(-125,-50) 38(-175,50) 39(-225,-50) 40(-275,50) 41(-325,-50) 42(-375,50) 43(-425,-50) 44(-475,50) 45(-525,-50) 46(-575,50) 47(-625,-50) 48(-675,50) 49(-725,-50) 50(-775,50) 51(-825,-50) 52(-875,50) 53(-925,-50) 54(-975,50) 55(-1025,-50) 56(-1075,50) 57(-1125,-50) 58(-1175,50) 59(-1225,-50) 60(-1275,50) 61(-1325,-50) 62(-1375,50) 63(-1425,-50) 64(-1475,50) 65(-1525,-50) 66(-1575,50) 67(-1625,-50) 68(-1675,50) 69(-1725,-50) 70(-1775,50) 71(-1825,-50) 72(-1875,50)
Top Overlay:
  lines w6: -2150,25 -2150,125 -1950,125 -1950,-15 -2035,-15 -2035,25 -2150,25 ; 1950,-15 1950,125 2150,125 2150,25 2035,25 2035,-15 1950,-15
  lines w10: -2270,-120 2270,-120 2270,160 -2270,160 -2270,-120
  lines w16: -2175,-145 -2130,-65 -2130,-35 -2160,-35 -2160,135 -2125,135 ; 2125,135 2160,135 2160,-35 2130,-35 2130,-65 2175,-145
Mechanical 16:
  lines w6: -2270,-30 -2170,-30 ; -2270,30 -2170,30 ; -2130,-30 -62,-30 ; -1945,30 -62,30 ; 1945,30 62,30 ; 2130,-30 62,-30 ; 2170,-30 2270,-30 ; 2170,30 2270,30 ; -62,-30 62,-30 ; -62,-30 -62,30 ; -62,30 62,30 ; 62,-30 62,30

## 822032-2 [mil]
pads (67):
  round 96 hole 96: 1(-2000,0)
  round 64 hole 64: 1(0,0) 1(2000,0)
  round 60 hole 40: 1(1675,-50)
  oct 60x60 hole 40: 2(1625,50) 3(1575,-50) 4(1525,50) 5(1475,-50) 6(1425,50) 7(1375,-50) 8(1325,50) 9(1275,-50) 10(1225,50) 11(1175,-50) 12(1125,50) 13(1075,-50) 14(1025,50) 15(975,-50) 16(925,50) 17(875,-50) 18(825,50) 19(775,-50) 20(725,50) 21(675,-50) 22(625,50) 23(575,-50) 24(525,50) 25(475,-50) 26(425,50) 27(375,-50) 28(325,50) 29(275,-50) 30(225,50) 31(175,-50) 32(125,50) 33(-125,-50) 34(-175,50) 35(-225,-50) 36(-275,50) 37(-325,-50) 38(-375,50) 39(-425,-50) 40(-475,50) 41(-525,-50) 42(-575,50) 43(-625,-50) 44(-675,50) 45(-725,-50) 46(-775,50) 47(-825,-50) 48(-875,50) 49(-925,-50) 50(-975,50) 51(-1025,-50) 52(-1075,50) 53(-1125,-50) 54(-1175,50) 55(-1225,-50) 56(-1275,50) 57(-1325,-50) 58(-1375,50) 59(-1425,-50) 60(-1475,50) 61(-1525,-50) 62(-1575,50) 63(-1625,-50) 64(-1675,50)
Top Overlay:
  lines w6: -1950,25 -1950,125 -1750,125 -1750,-15 -1835,-15 -1835,25 -1950,25 ; 1750,-15 1750,125 1950,125 1950,25 1835,25 1835,-15 1750,-15
  lines w10: -2070,-120 2070,-120 2070,160 -2070,160 -2070,-120
  lines w16: -1975,-145 -1930,-65 -1930,-35 -1960,-35 -1960,135 -1925,135 ; 1925,135 1960,135 1960,-35 1930,-35 1930,-65 1975,-145
Mechanical 16:
  lines w6: -2070,-30 -1965,-30 ; -2070,30 -1965,30 ; -1930,-30 -62,-30 ; -1745,30 -62,30 ; 1745,30 62,30 ; 1930,-30 62,-30 ; 1970,-30 2070,-30 ; 1970,30 2070,30 ; -62,-30 62,-30 ; -62,-30 -62,30 ; -62,30 62,30 ; 62,-30 62,30

## 822032-4 [mil]
pads (75):
  round 96 hole 96: 1(-2200,0)
  round 64 hole 64: 1(0,0) 1(2200,0)
  round 60 hole 40: 1(1875,-50)
  oct 60x60 hole 40: 2(1825,50) 3(1775,-50) 4(1725,50) 5(1675,-50) 6(1625,50) 7(1575,-50) 8(1525,50) 9(1475,-50) 10(1425,50) 11(1375,-50) 12(1325,50) 13(1275,-50) 14(1225,50) 15(1175,-50) 16(1125,50) 17(1075,-50) 18(1025,50) 19(975,-50) 20(925,50) 21(875,-50) 22(825,50) 23(775,-50) 24(725,50) 25(675,-50) 26(625,50) 27(575,-50) 28(525,50) 29(475,-50) 30(425,50) 31(375,-50) 32(325,50) 33(275,-50) 34(225,50) 35(175,-50) 36(125,50) 37(-125,-50) 38(-175,50) 39(-225,-50) 40(-275,50) 41(-325,-50) 42(-375,50) 43(-425,-50) 44(-475,50) 45(-525,-50) 46(-575,50) 47(-625,-50) 48(-675,50) 49(-725,-50) 50(-775,50) 51(-825,-50) 52(-875,50) 53(-925,-50) 54(-975,50) 55(-1025,-50) 56(-1075,50) 57(-1125,-50) 58(-1175,50) 59(-1225,-50) 60(-1275,50) 61(-1325,-50) 62(-1375,50) 63(-1425,-50) 64(-1475,50) 65(-1525,-50) 66(-1575,50) 67(-1625,-50) 68(-1675,50) 69(-1725,-50) 70(-1775,50) 71(-1825,-50) 72(-1875,50)
Top Overlay:
  lines w6: -2150,25 -2150,125 -1950,125 -1950,-15 -2035,-15 -2035,25 -2150,25 ; 1950,-15 1950,125 2150,125 2150,25 2035,25 2035,-15 1950,-15
  lines w10: -2270,-120 2270,-120 2270,160 -2270,160 -2270,-120
  lines w16: -2175,-145 -2130,-65 -2130,-35 -2160,-35 -2160,135 -2125,135 ; 2125,135 2160,135 2160,-35 2130,-35 2130,-65 2175,-145
Mechanical 16:
  lines w6: -2270,-30 -2165,-30 ; -2270,30 -2165,30 ; -2125,-30 -62,-30 ; -1945,30 -62,30 ; 1945,30 62,30 ; 2130,-30 62,-30 ; 2165,30 2270,30 ; 2170,-30 2270,-30 ; -62,-30 62,-30 ; -62,-30 -62,30 ; -62,30 62,30 ; 62,-30 62,30

## 822032-5 [mil]
pads (83):
  round 96 hole 96: 1(-2400,0)
  round 64 hole 64: 1(0,0) 1(2400,0)
  round 60 hole 40: 1(2075,-50)
  oct 60x60 hole 40: 2(2025,50) 3(1975,-50) 4(1925,50) 5(1875,-50) 6(1825,50) 7(1775,-50) 8(1725,50) 9(1675,-50) 10(1625,50) 11(1575,-50) 12(1525,50) 13(1475,-50) 14(1425,50) 15(1375,-50) 16(1325,50) 17(1275,-50) 18(1225,50) 19(1175,-50) 20(1125,50) 21(1075,-50) 22(1025,50) 23(975,-50) 24(925,50) 25(875,-50) 26(825,50) 27(775,-50) 28(725,50) 29(675,-50) 30(625,50) 31(575,-50) 32(525,50) 33(475,-50) 34(425,50) 35(375,-50) 36(325,50) 37(275,-50) 38(225,50) 39(175,-50) 40(125,50) 41(-125,-50) 42(-175,50) 43(-225,-50) 44(-275,50) 45(-325,-50) 46(-375,50) 47(-425,-50) 48(-475,50) 49(-525,-50) 50(-575,50) 51(-625,-50) 52(-675,50) 53(-725,-50) 54(-775,50) 55(-825,-50) 56(-875,50) 57(-925,-50) 58(-975,50) 59(-1025,-50) 60(-1075,50) 61(-1125,-50) 62(-1175,50) 63(-1225,-50) 64(-1275,50) 65(-1325,-50) 66(-1375,50) 67(-1425,-50) 68(-1475,50) 69(-1525,-50) 70(-1575,50) 71(-1625,-50) 72(-1675,50) 73(-1725,-50) 74(-1775,50) 75(-1825,-50) 76(-1875,50) 77(-1925,-50) 78(-1975,50) 79(-2025,-50) 80(-2075,50)
Top Overlay:
  lines w6: -2350,25 -2350,125 -2150,125 -2150,-15 -2235,-15 -2235,25 -2350,25 ; 2150,-15 2150,125 2350,125 2350,25 2235,25 2235,-15 2150,-15
  lines w10: -2470,-120 2470,-120 2470,160 -2470,160 -2470,-120
  lines w16: -2375,-145 -2330,-65 -2330,-35 -2360,-35 -2360,135 -2325,135 ; 2325,135 2360,135 2360,-35 2330,-35 2330,-65 2375,-145
Mechanical 16:
  lines w6: -2470,-30 -2365,-30 ; -2470,30 -2365,30 ; -2335,-30 -62,-30 ; -2145,30 -62,30 ; 2145,30 62,30 ; 2330,-30 62,-30 ; 2365,-30 2470,-30 ; 2365,30 2470,30 ; -62,-30 62,-30 ; -62,-30 -62,30 ; -62,30 62,30 ; 62,-30 62,30